# Altium footprint library BRT_Components.PcbLib: 132 footprints (part 4 of 9)
Each footprint in its own frame and in the unit in brackets; x right, y up, seen from the top. Pads: shape width x height; smd on the part's side, far side on the other; paste and mask are expansions set on the pad; w line width, h text height; cw(c..) or ccw(c..) is an arc to the next point about the centre after c.
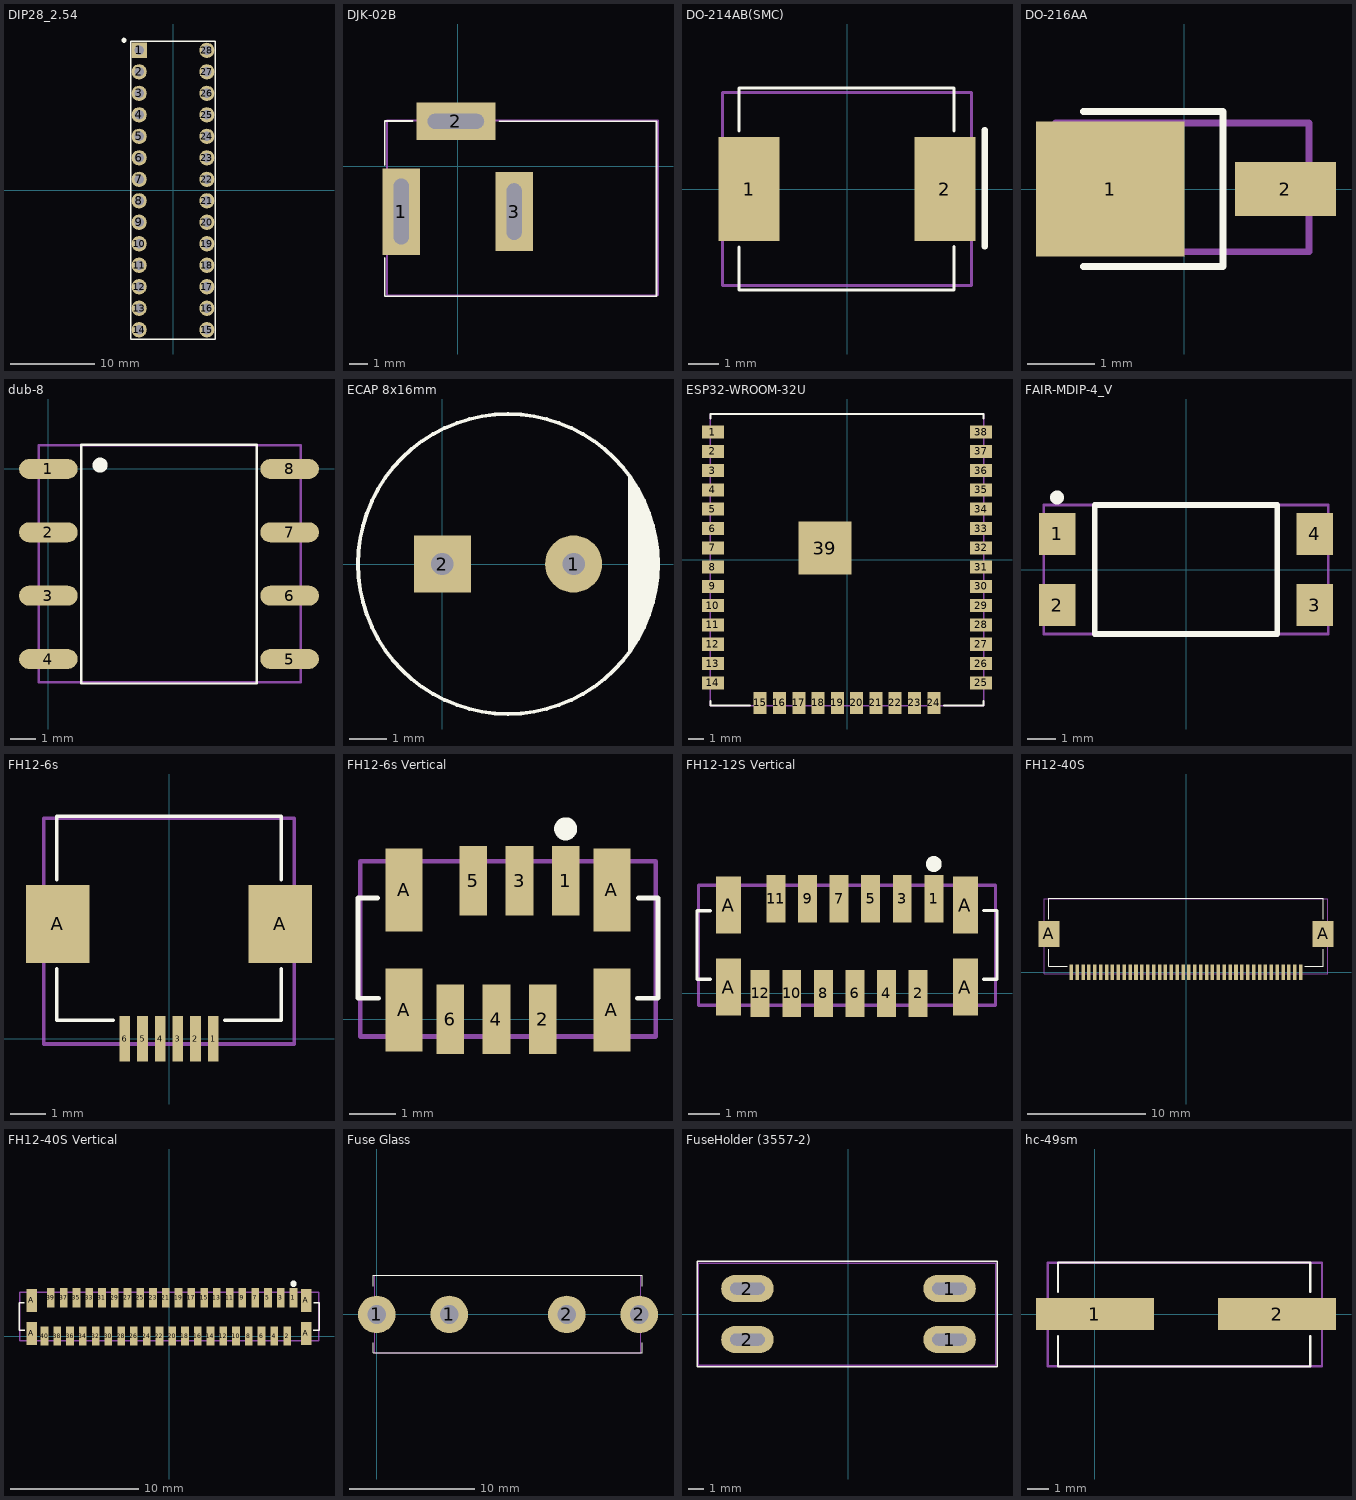
[diagram p3: the footprints below, top view; thin cyan lines are the x and y axes]

## DIP28_2.54 [mm]
pads (28):
  rect 1.8x1.8 hole 1.1: 1(-4,16.51)
  round 1.8 hole 1.1: 2(-4,13.97) 3(-4,11.43) 4(-4,8.89) 5(-4,6.35) 6(-4,3.81) 7(-4,1.27) 8(-4,-1.27) 9(-4,-3.81) 10(-4,-6.35) 11(-4,-8.89) 12(-4,-11.43) 13(-4,-13.97) 14(-4,-16.51) 15(4,-16.51) 16(4,-13.97) 17(4,-11.43) 18(4,-8.89) 19(4,-6.35) 20(4,-3.81) 21(4,-1.27) 22(4,1.27) 23(4,3.81) 24(4,6.35) 25(4,8.89) 26(4,11.43) 27(4,13.97) 28(4,16.51)
Top Overlay:
  circle w0.3: c-5.8,17.7 r0.15
  lines w0.15: -5,-17.6 -5,17.6 5,17.6 5,-17.6 -5,-17.6
3D body "dil_socket.stp": height 4.1, standoff -3.27, extent -5.05,-17.75 5.05,17.75
3D body "28 pin dip.step": height 7.65, standoff 1.43, extent -3.837,-18.075 4.037,17.866

## DJK-02B [mm]
pads (3):
  rect 2x4.6 hole 0.8 slot 3.5 at 90 deg: 1(-3,-2.4)
  rect 4.2x2 hole 0.8 slot 3 at 0 deg: 2(-0.1,2.4)
  rect 2x4.2 hole 0.8 slot 3 at 90 deg: 3(3,-2.4)
Top Overlay:
  lines w0.1: -3.875,-4.875 -3.875,-6.9 10.575,-6.9 10.575,2.4 2.225,2.4 ; -3.875,0.075 -3.875,2.425 -2.4,2.425
Mechanical 13:
  lines w0.1: -3.75,-6.85 -3.75,2.45 10.65,2.45 10.65,-6.85 -3.75,-6.85
3D body "DJK-02B (DS-261A).step": height 11, standoff -3.5, extent -3.75,-6.85 10.65,2.45

## DO-214AB(SMC) [mm]
pads (2):
  rect 2x3.4 smd: 1(-3.2,0) 2(3.2,0)
Top Overlay:
  lines w0.1: -3.525,-1.9 -3.525,-3.3 3.5,-3.3 3.5,-1.875 ; -3.525,1.9 -3.525,3.3 3.5,3.3 3.5,1.9
  lines w0.2: 4.5,-1.875 4.5,1.925
Mechanical 13:
  lines w0.1: -4.064,-3.15 -4.064,3.149 4.064,3.149 4.064,-3.15 -4.064,-3.15
3D body "DO-214AB(SMC).step": height 2.77, standoff 0.13, extent -4.064,-3.15 4.064,3.149

## DO-216AA [mm]
pads (2):
  rect 2.2x2 smd: 1(-1.1,0)
  rect 1.5x0.8 smd: 2(1.5,0)
Top Overlay:
  lines w0.1: -1.5,-1.15 0.575,-1.15 0.575,1.15 -1.5,1.15
Mechanical 13:
  lines w0.1: -1.91,-0.93 -1.91,0.98 1.85,0.98 1.85,-0.93 -1.91,-0.93
3D body "DO-216AA.step": height 1.02, standoff 0, extent -1.91,-0.93 1.85,0.98

## dub-8 [mm]
pads (8):
  oval 2.35x0.8 smd: 1(0,0) 2(0,-2.54) 3(0,-5.08) 4(0,-7.62) 5(9.675,-7.62) 6(9.675,-5.08) 7(9.675,-2.54) 8(9.675,0)
Top Overlay:
  circle w0.5: c2.075,0.15 r0.05
  lines w0.1: 1.325,-8.6 1.325,0.975 8.35,0.975 8.35,-8.6 1.325,-8.6
Mechanical 13:
  lines w0.1: -0.375,-8.55 -0.375,0.95 10.125,0.95 10.125,-8.55 -0.375,-8.55
3D body "User Library-8-DUB-1.STEP": height 4.2, standoff 0, extent -0.375,-8.55 10.125,0.95

## ECAP 8x16mm [mil]
pads (2):
  round 60 hole 23.62: 1(137.8,0)
  rect 60x60 hole 23.62: 2(0,0)
Top Overlay:
  circle w3.94: c68.9,0 r157.48
  region: 196.85,-91.54 196.85,91.54 197.5,90.89 204.51,80.97 215.33,59.21 222.68,36.05 226.39,12.04 226.37,-12.26 222.63,-36.26 215.25,-59.41 204.4,-81.16 197.38,-91.07
  lines w3.94: 196.85,-91.54 196.85,91.54
3D body "User Library-Cap-EL(8x16-3_5).step": height 633.94, standoff -125.98, extent -88.58,-157.47 226.46,157.48

## ESP32-WROOM-32U [mm]
pads (39):
  rect 1.45x0.86 smd: 1(-8.83,8.41) 2(-8.83,7.14) 3(-8.83,5.87) 4(-8.83,4.6) 5(-8.83,3.33) 6(-8.83,2.06) 7(-8.83,0.79) 8(-8.83,-0.48) 9(-8.83,-1.75) 10(-8.83,-3.02) 11(-8.83,-4.29) 12(-8.83,-5.56) 13(-8.83,-6.83) 14(-8.83,-8.1) 25(8.83,-8.1) 26(8.83,-6.83) 27(8.83,-5.56) 28(8.83,-4.29) 29(8.83,-3.02) 30(8.83,-1.75) 31(8.83,-0.48) 32(8.83,0.79) 33(8.83,2.06) 34(8.83,3.33) 35(8.83,4.6) 36(8.83,5.87) 37(8.83,7.14) 38(8.83,8.41)
  rect 0.86x1.45 smd: 15(-5.715,-9.43) 16(-4.445,-9.43) 17(-3.175,-9.43) 18(-1.905,-9.43) 19(-0.635,-9.43) 20(0.635,-9.43) 21(1.905,-9.43) 22(3.175,-9.43) 23(4.445,-9.43) 24(5.715,-9.43)
  rect 3.5x3.5 smd: 39(-1.46,0.77)
Top Overlay:
  lines w0.127: -9,-9.3 -9,-9.6 -6.4,-9.6 ; -9,9.3 -9,9.6 9,9.6 9,9.3 ; 6.4,-9.6 9,-9.6 9,-9.3
Mechanical 13:
  lines w0.1: -9,-9.6 9,-9.6 9,9.6 -9,9.6 -9,-9.6
3D body "ESP32-WROOM-32U--3DModel-STEP-56544.STEP": height 3.3, standoff 0, extent -9,-9.6 9,9.6

## FAIR-MDIP-4_V [mm]
pads (4):
  rect 1.3x1.5 smd: 1(-4.6,1.27) 2(-4.6,-1.27) 3(4.6,-1.27) 4(4.6,1.27)
Top Overlay:
  circle w0.25: c-4.6,2.57 r0.125
  lines w0.2: -3.25,-2.3 3.25,-2.3 3.25,2.3 -3.25,2.3 -3.25,-2.3
Mechanical 13:
  lines w0.1: -5.075,-2.3 5.075,-2.3 5.075,2.3 -5.075,2.3 -5.075,-2.3 ; -3.25,-2.3 3.25,-2.3 3.25,2.3 -3.25,2.3 -3.25,-2.3
3D body "SOP254P1020X385-4L.step": height 3.85, standoff 0, extent -5.08,-2.3 5.08,2.3

## FH12-6s [mm]
pads (8):
  rect 0.3x1.3 smd mask+0.05: 1(1.25,0) 2(0.75,0) 3(0.25,0) 4(-0.25,0) 5(-0.75,0) 6(-1.25,0)
  rect 1.8x2.2 smd mask+0.11: A(-3.15,3.25) A(3.15,3.25)
Top Overlay:
  lines w0.1: -3.175,1.975 -3.175,0.525 -1.575,0.525 ; -3.175,4.5 -3.175,6.3 3.175,6.3 3.175,4.5 ; 1.575,0.525 3.175,0.525 3.175,1.975
Mechanical 13:
  lines w0.1: -3.55,-0.15 -3.55,6.25 3.55,6.25 3.55,-0.15 -3.55,-0.15
3D body "User Library-Hirose_FH12-6S-0_5SH.STEP": height 2.1, standoff 0, extent -3.55,-0.15 3.55,6.25

## FH12-6s Vertical [mm]
pads (10):
  rect 0.6x1.5 smd: 1(9.5,3) 2(9,0) 3(8.5,3) 4(8,0) 5(7.5,3) 6(7,0)
  rect 0.8x1.8 smd: A(6,0.2) A(6,2.8) A(10.5,0.2) A(10.5,2.8)
Top Overlay:
  circle w0.3: c9.5,4.125 r0.1
  lines w0.1: 5.425,2.625 5,2.625 5,0.45 5.45,0.45 ; 11.05,0.45 11.5,0.45 11.5,2.625 11.075,2.625
Mechanical 13:
  lines w0.1: 5.05,-0.375 5.05,3.425 11.45,3.425 11.45,-0.375 5.05,-0.375
3D body "FH12-6S-0.5SV.stp": height 5.5, standoff 0, extent 5.05,-0.375 11.45,3.425

## FH12-12S Vertical [mm]
pads (16):
  rect 0.6x1.5 smd: 1(9.75,3) 2(9.25,0) 3(8.75,3) 4(8.25,0) 5(7.75,3) 6(7.25,0) 7(6.75,3) 8(6.25,0) 9(5.75,3) 10(5.25,0) 11(4.75,3) 12(4.25,0)
  rect 0.8x1.8 smd: A(3.25,0.2) A(3.25,2.8) A(10.75,0.2) A(10.75,2.8)
Top Overlay:
  circle w0.3: c9.75,4.1 r0.1
  lines w0.1: 2.675,0.45 2.25,0.45 2.25,2.621 2.675,2.621 ; 11.325,0.45 11.75,0.45 11.75,2.625 11.325,2.625
Mechanical 13:
  lines w0.1: 2.3,-0.375 11.7,-0.375 11.7,3.425 2.3,3.425 2.3,-0.375
3D body "FH12-12S-0.5SV.stp": height 5.53, standoff 0.03, extent 2.3,-0.375 11.7,3.425

## FH12-40S [mm]
pads (42):
  rect 0.3x1.3 smd mask+0.05: 1(9.75,0) 2(9.25,0) 3(8.75,0) 4(8.25,0) 5(7.75,0) 6(7.25,0) 7(6.75,0) 8(6.25,0) 9(5.75,0) 10(5.25,0) 11(4.75,0) 12(4.25,0) 13(3.75,0) 14(3.25,0) 15(2.75,0) 16(2.25,0) 17(1.75,0) 18(1.25,0) 19(0.75,0) 20(0.25,0) 21(-0.25,0) 22(-0.75,0) 23(-1.25,0) 24(-1.75,0) 25(-2.25,0) 26(-2.75,0) 27(-3.25,0) 28(-3.75,0) 29(-4.25,0) 30(-4.75,0) 31(-5.25,0) 32(-5.75,0) 33(-6.25,0) 34(-6.75,0) 35(-7.25,0) 36(-7.75,0) 37(-8.25,0) 38(-8.75,0) 39(-9.25,0) 40(-9.75,0)
  rect 1.8x2.2 smd mask+0.11: A(-11.65,3.25) A(11.65,3.25)
Top Overlay:
  lines w0.1: -11.675,1.975 -11.675,0.525 -10.075,0.525 ; -11.675,4.5 -11.675,6.3 11.675,6.3 11.675,4.5 ; 10.075,0.525 11.675,0.525 11.675,1.975
Mechanical 13:
  lines w0.1: -12.05,-0.15 -12.05,6.25 12.05,6.25 12.05,-0.15 -12.05,-0.15
3D body "User Library-Hirose_FH12S-40S-0_5SH.STEP": height 2.4, standoff 0, extent -12.05,-0.15 12.05,6.25

## FH12-40S Vertical [mm]
pads (44):
  rect 0.6x1.5 smd: 1(9.75,3) 2(9.25,0) 3(8.75,3) 4(8.25,0) 5(7.75,3) 6(7.25,0) 7(6.75,3) 8(6.25,0) 9(5.75,3) 10(5.25,0) 11(4.75,3) 12(4.25,0) 13(3.75,3) 14(3.25,0) 15(2.75,3) 16(2.25,0) 17(1.75,3) 18(1.25,0) 19(0.75,3) 20(0.25,0) 21(-0.25,3) 22(-0.75,0) 23(-1.25,3) 24(-1.75,0) 25(-2.25,3) 26(-2.75,0) 27(-3.25,3) 28(-3.75,0) 29(-4.25,3) 30(-4.75,0) 31(-5.25,3) 32(-5.75,0) 33(-6.25,3) 34(-6.75,0) 35(-7.25,3) 36(-7.75,0) 37(-8.25,3) 38(-8.75,0) 39(-9.25,3) 40(-9.75,0)
  rect 0.8x1.8 smd: A(-10.75,0.2) A(-10.75,2.8) A(10.75,0.2) A(10.75,2.8)
Top Overlay:
  circle w0.3: c9.75,4.1 r0.1
  lines w0.1: -11.325,2.625 -11.75,2.625 -11.75,0.45 -11.3,0.45 ; 11.3,0.45 11.75,0.45 11.75,2.625 11.325,2.625
Mechanical 13:
  lines w0.1: -11.675,-0.375 11.725,-0.375 11.725,3.425 -11.675,3.425 -11.675,-0.375
3D body "FH12-40S-0.5SV.stp": height 5.55, standoff 0.05, extent -11.675,-0.375 11.725,3.425

## Fuse Glass [mm]
pads (4):
  round 3 hole 1.5: 1(0,0) 1(5.8,0) 2(15.2,0) 2(21,0)
Top Overlay:
  lines w0.1: -0.3,-2.25 -0.3,-3.075 21.225,-3.075 21.225,-2.25 ; -0.3,2.25 -0.3,3.15 21.225,3.15 21.225,2.25
Mechanical 13:
  lines w0.1: -0.175,-3.05 -0.175,3.15 21.1,3.15 21.1,-3.05 -0.175,-3.05
3D body "ALSRobot-Fuse.STEP": height 9.59, standoff -3.31, extent -0.175,-3.05 21.103,3.14

## FuseHolder (3557-2) [mm] "Automotive fuse holder"
pads (4):
  rrect100% 3.5x1.8 hole 0.8 slot 2.3 at 0 deg: 1(6.735,-1.7) 1(6.735,1.7) 2(-6.735,-1.7) 2(-6.735,1.7)
Top Overlay:
  lines w0.1: -10.1,-3.5 9.9,-3.5 9.9,3.5 -10.1,3.5 -10.1,-3.5
Mechanical 13:
  lines w0.1: -10,-3.4 9.8,-3.4 9.8,3.4 -10,3.4 -10,-3.4
3D body "PN3557-2.STEP": height 7.39, standoff -2.77, extent -9.978,-3.348 9.834,3.383

## hc-49sm [mm]
pads (2):
  rect 5.5x1.5 smd: 1(0,0) 2(8.5,0)
Top Overlay:
  lines w0.1: -1.725,-1.025 -1.725,-2.45 10.05,-2.45 10.05,-1.025 ; -1.725,1.025 -1.725,2.4 10.05,2.4 10.05,1.025
Mechanical 13:
  lines w0.1: -2.2,-2.44 -2.2,2.39 10.6,2.39 10.6,-2.44 -2.2,-2.44
3D body "User Library-Crystal HC49_US-SM.step": height -0.38, standoff -4.68, extent -2.2,-2.44 10.6,2.39